# Altium footprint library PCBLIB.PcbLib: 775 footprints (part 36 of 49)
Each footprint in its own frame and in the unit in brackets; x right, y up, seen from the top. Pads: shape width x height; smd on the part's side, far side on the other; paste and mask are expansions set on the pad; w line width, h text height; cw(c..) or ccw(c..) is an arc to the next point about the centre after c.
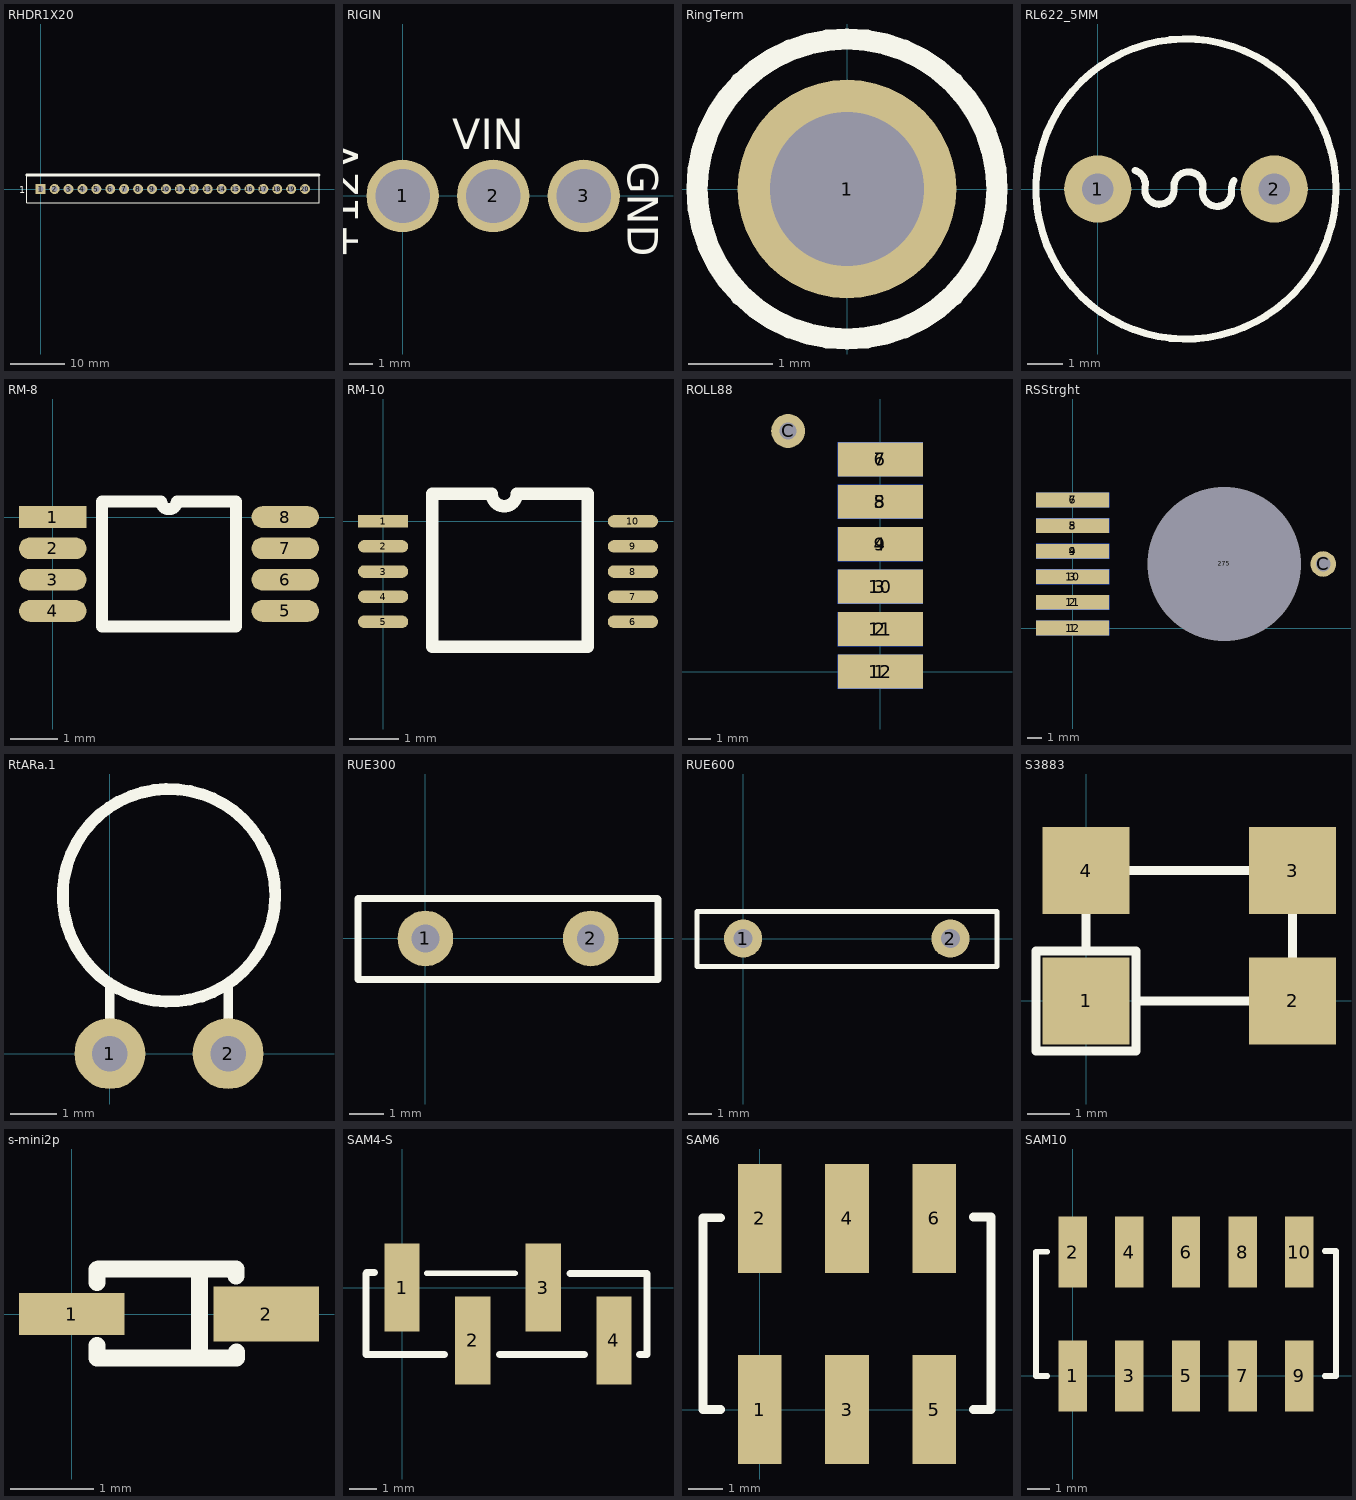
[diagram p35: the footprints below, top view; thin cyan lines are the x and y axes]

## RHDR1X20 [mil]
pads (20):
  rect 72x72 hole 42: 1(0,0)
  round 72 hole 42: 2(100,0) 3(200,0) 4(300,0) 5(400,0) 6(500,0) 7(600,0) 8(700,0) 9(800,0) 10(900,0) 11(1000,0) 12(1100,0) 13(1200,0) 14(1300,0) 15(1400,0) 16(1500,0) 17(1600,0) 18(1700,0) 19(1799.75,0) 20(1900,0)
TopOverlay:
  lines w8: -100,100 -100,-100 2000,-100 2000,100
  lines w20: -100,100 2000,100
  text "1" at -156,-30 h50
Mechanical4:
  text ".341" at 0,0 h1

## RIGIN [mil]
pads (3):
  round 120 hole 90: 1(0,0) 2(150,0) 3(300,0)
TopOverlay:
  text "+12V" at -74,-104 h50
  text "VIN" at 82,77 h50
  text "GND" at 373,57 h50

## RingTerm [mil]
pads (1):
  round 102 hole 72: 1(0,0)
TopOverlay:
  circle w10: c0,0 r70
Mechanical4:
  text ".650" at 0,0 h1

## RL622_5MM [mil]
pads (2):
  round 75 hole 35: 1(0,0) 2(197,0)
TopOverlay:
  circle w8: c98.5,0 r167.5
  lines w8: 41.37,20.83 cw(c36.82,5.2) 52.82,2.2 ccw(c68.82,-0.8) 85,1 cw(c101.18,2.8) 117.18,-0.2 ccw(c133.18,-3.2) 149.36,-1.4 cw(c165.54,0.39) 151.96,9.37

## RM-8 [mil]
pads (8):
  rect 56x18 smd: 1(0,0)
  oval 56x18 smd: 2(0,-26) 3(0,-52) 4(0,-78) 5(193,-78) 6(193,-52) 7(193,-26) 8(193,0)
TopOverlay:
  lines w10: 41,-91 152,-91 152,13 103,13 cw(c96.5,13) 90,13 41,13 41,-91

## RM-10 [mil]
pads (10):
  rect 40x10 smd: 1(0,0)
  oval 40x10 smd: 2(0,-20) 3(0,-40) 4(0,-60) 5(0,-80) 6(199,-80) 7(199,-60) 8(199,-40) 9(199,-20) 10(199,0)
TopOverlay:
  lines w10: 84.5,22 39,22 39,-100 163,-100 163,22 108.5,22 ; 86.5,22 ccw(c96.5,22) 106.5,22
Mechanical4:
  text ".059" at 0,0 h1

## ROLL88 [mil]
pads (13):
  rect 150x60 smd: 1(0,0) 2(0,75) 3(0,150) 4(0,225) 5(0,300) 6(0,375)
  rect 150x60 smd far side: 7(0,375) 8(0,300) 9(0,225) 10(0,150) 11(0,75) 12(0,0)
  round 60 hole 30: C(-163,425)

## RSStrght [mil]
pads (14):
  rect 200x40 smd: 1(0,0) 2(0,70) 3(0,140) 4(0,210) 5(0,280) 6(0,350)
  rect 200x40 smd far side: 7(0,350) 8(0,280) 9(0,210) 10(0,140) 11(0,70) 12(0,0)
  round 40 hole 420 unplated: 275(415,175)
  round 70 hole 40: C(685,175)

## RtARa.1 [mil]
pads (2):
  round 60 hole 30: 1(0,0) 2(100,0)
TopOverlay:
  circle w10: c50,134 r90
  lines w8: 0,0 0,40 0,58 ; 100,0 100,39 100,57

## RUE300 [mil] "3.0 amp Restable fuse"
height 500
pads (2):
  round 64 hole 32: 1(0,0) 2(190,0)
TopOverlay:
  lines w8: -77.45,-47.05 -77.45,45.7 266.99,45.7 267.37,45.31 267.37,-47.05 -77.45,-47.05

## RUE600 [mil] "6.0 amp Restable fuse"
height 800
pads (2):
  round 64 hole 32: 1(0,0) 2(348,0)
TopOverlay:
  lines w8: 426.2,-47.05 -77.45,-47.05 -77.45,45.7 426.2,45.7 ; 426.2,-46.76 426.2,45.6

## S3883 [mil]
pads (4):
  rect 80x80 smd: 1(0,0) 2(190,0) 3(190,120) 4(0,120)
TopOverlay:
  lines w8: 0,46 0,80 ; 40,120 150,120 ; 46,0 150,0 ; 190,40 190,80 ; -46,-46 46,-46 46,46 -46,46 -46,-46

## s-mini2p [mil]
pads (2):
  rect 50x20 smd: 1(0,0)
  rect 50x26 smd: 2(92,0)
TopOverlay:
  lines w8: 12,-20.92 12,-15 ; 12,15 12,21.08 ; 12.69,-20.85 77.69,-20.85 ; 12.69,21.28 77.69,21.28 ; 60.49,-20.85 60.49,20.75 ; 77.69,18 77.69,21.08 ; 78,-20.92 78,-18

## SAM4-S [mm]
pads (4):
  rect 1.27x3.17 smd: 1(0,0) 2(2.54,-1.905) 3(5.08,0) 4(7.62,-1.905)
TopOverlay:
  lines w0.203: 0.889,0.508 4.064,0.508
  lines w0.254: -0.991,0.533 -1.27,0.533 -1.295,0.508 -1.295,-2.413 1.524,-2.413 ; 3.505,-2.413 6.553,-2.413 ; 6.045,0.508 8.814,0.508 8.814,-2.413 8.534,-2.413
  text "." at -1.372,1.295 h1.78

## SAM6 [mm]
pads (6):
  rect 1.27x3.17 smd: 1(0,0) 2(0,5.563) 3(2.54,0) 4(2.54,5.563) 5(5.08,0) 6(5.08,5.563)
TopOverlay:
  lines w0.254: -1.143,0 -1.651,0 -1.651,5.581 -1.143,5.581 ; 6.223,0 6.731,0 6.731,2.642 6.731,5.606 6.223,5.606
  text "." at -1.905,-1.905 h1.78

## SAM10 [mm]
pads (10):
  rect 1.27x3.17 smd: 1(0,0) 2(0,5.563) 3(2.54,0) 4(2.54,5.563) 5(5.08,0) 6(5.08,5.563) 7(7.62,0) 8(7.62,5.563) 9(10.16,0) 10(10.16,5.563)
TopOverlay:
  lines w0.254: -1.143,0 -1.651,0 -1.651,5.581 -1.143,5.581 ; 11.303,0 11.811,0 11.811,5.606 11.303,5.606
  text "." at -1.905,-1.905 h1.78